# Altium footprint library TE0706.PcbLib: 46 footprints (part 2 of 3)
Each footprint in its own frame and in the unit in brackets; x right, y up, seen from the top. Pads: shape width x height; smd on the part's side, far side on the other; paste and mask are expansions set on the pad; w line width, h text height; cw(c..) or ccw(c..) is an arc to the next point about the centre after c.
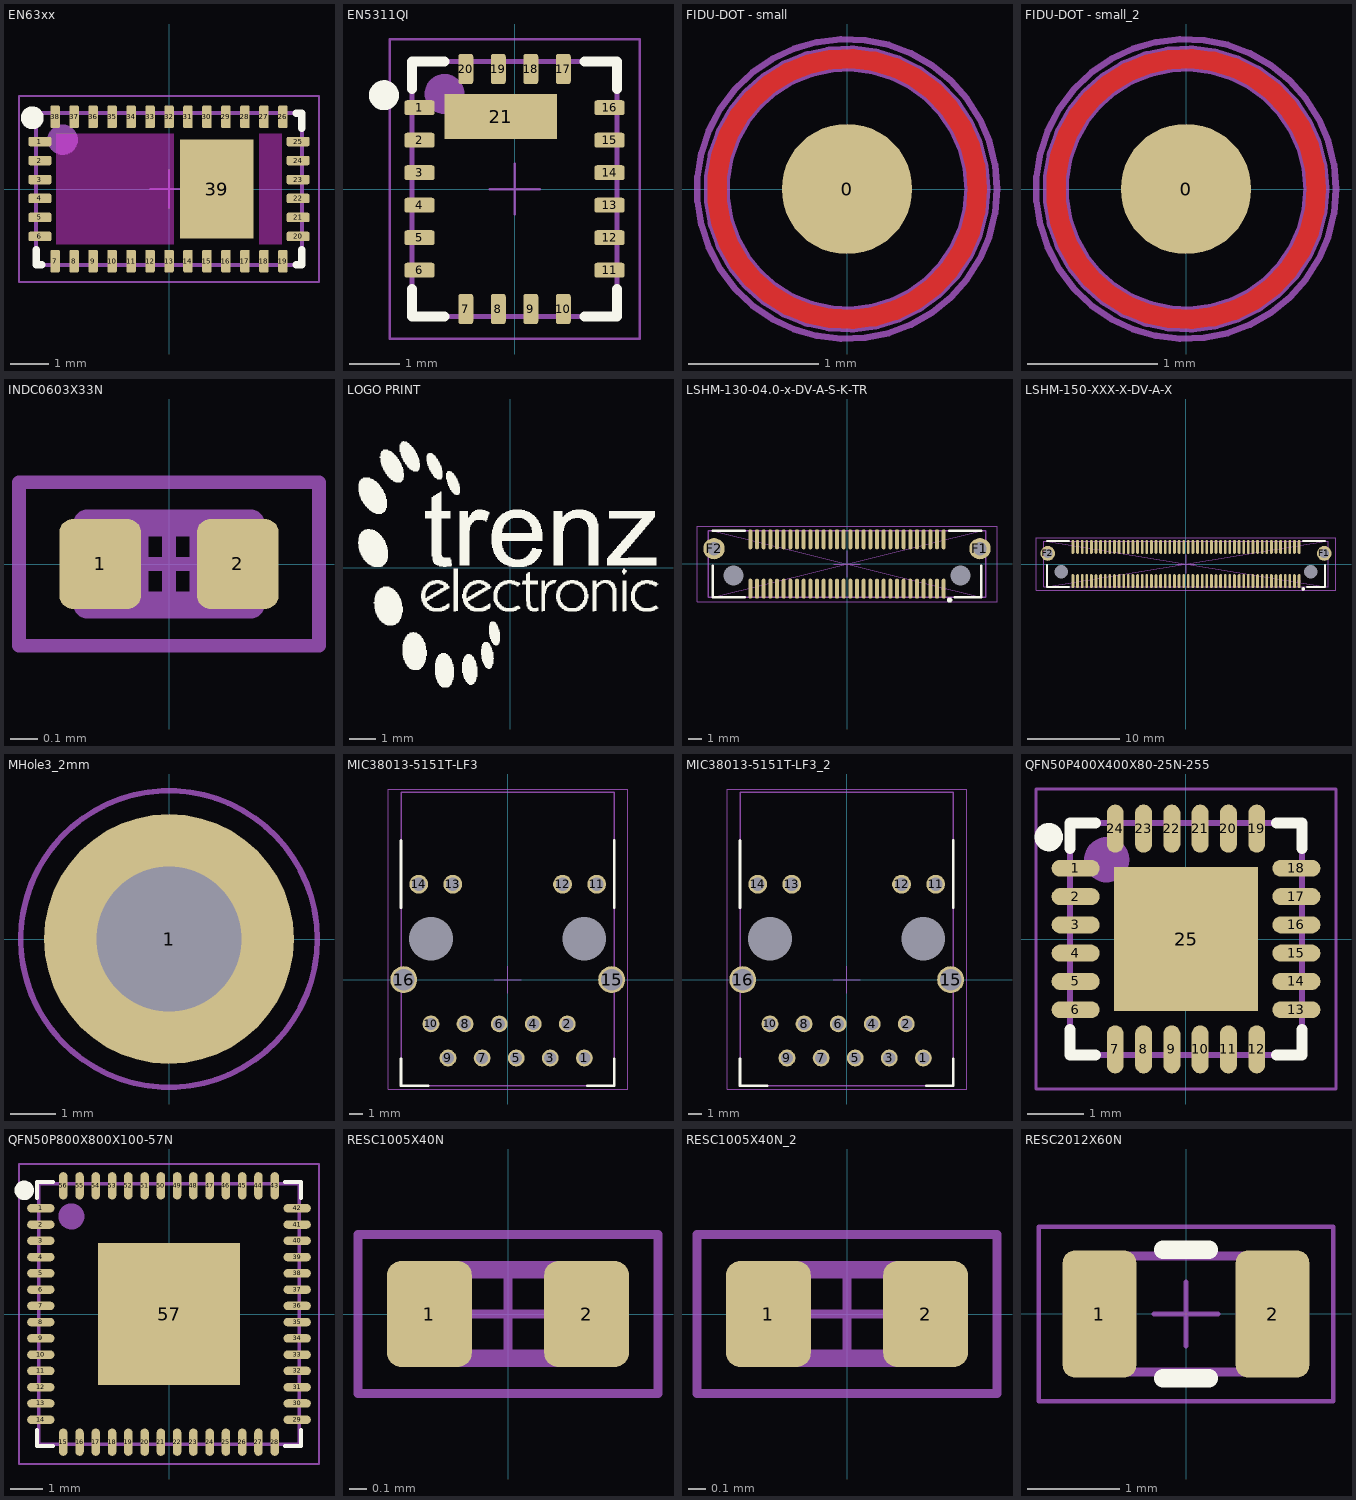
[diagram p1: the footprints below, top view; thin cyan lines are the x and y axes]

## EN63xx [mm]
height 1.9
pads (39):
  rrect33% 0.6x0.25 smd: 1(-3.4,1.25) 2(-3.4,0.75) 3(-3.4,0.25) 4(-3.4,-0.25) 5(-3.4,-0.75) 6(-3.4,-1.25) 20(3.4,-1.25) 21(3.4,-0.75) 22(3.4,-0.25) 23(3.4,0.25) 24(3.4,0.75) 25(3.4,1.25)
  rrect33% 0.25x0.6 smd: 7(-3,-1.9) 8(-2.5,-1.9) 9(-2,-1.9) 10(-1.5,-1.9) 11(-1,-1.9) 12(-0.5,-1.9) 13(0,-1.9) 14(0.5,-1.9) 15(1,-1.9) 16(1.5,-1.9) 17(2,-1.9) 18(2.5,-1.9) 19(3,-1.9) 26(3,1.9) 27(2.5,1.9) 28(2,1.9) 29(1.5,1.9) 30(1,1.9) 31(0.5,1.9) 32(0,1.9) 33(-0.5,1.9) 34(-1,1.9) 35(-1.5,1.9) 36(-2,1.9) 37(-2.5,1.9) 38(-3,1.9)
  rect 1.94x2.6 smd: 39(1.255,0)
Top Layer keep-out:
  region: -2.975,1.45 -2.975,-1.45 0.125,-1.45 0.125,1.45
  region: 2.975,1.45 2.975,-1.45 2.375,-1.45 2.375,1.45
Top Overlay:
  circle w0.3: c-3.6,1.875 r0.15
  lines w0.2: -3.5,-1.6 -3.5,-2 -3.35,-2 ; 3.35,-2 3.5,-2 3.5,-1.6 ; 3.35,2 3.5,2 3.5,1.6
Mechanical 13:
  circle w0.4: c-2.8,1.3 r0.2
  lines w0.1: -3.5,-2 3.5,-2 3.5,2 -3.5,2 -3.5,-2
  text ".Designator" at -0.5,-0.5 h1
Mechanical 15:
  lines w0.05: -0.5,0 0.5,0 ; 0,-0.5 0,0.5 ; -3.95,-2.45 3.95,-2.45 3.95,2.45 -3.95,2.45 -3.95,-2.45
3D body: height 1.91, standoff 0, extent -3.098,1.001 -2.5,1.6
3D body: height 1.9, standoff 0, extent -3.5,-2 3.5,2

## EN5311QI [mm]
height 1.15
pads (21):
  rrect33% 0.6x0.3 smd: 1(-1.9,1.625) 2(-1.9,0.975) 3(-1.9,0.325) 4(-1.9,-0.325) 5(-1.9,-0.975) 6(-1.9,-1.625) 11(1.9,-1.625) 12(1.9,-0.975) 13(1.9,-0.325) 14(1.9,0.325) 15(1.9,0.975) 16(1.9,1.625)
  rrect33% 0.3x0.6 smd: 7(-0.975,-2.4) 8(-0.325,-2.4) 9(0.325,-2.4) 10(0.975,-2.4) 17(0.975,2.4) 18(0.325,2.4) 19(-0.325,2.4) 20(-0.975,2.4)
  rect 2.25x0.9 smd: 21(-0.275,1.45)
Top Overlay:
  circle w0.3: c-2.61,1.875 r0.15
  lines w0.2: -2.05,-2 -2.05,-2.55 -1.4,-2.55 ; -2.05,2 -2.05,2.55 -1.4,2.55 ; 1.4,-2.55 2.05,-2.55 2.05,-2 ; 1.4,2.55 2.05,2.55 2.05,2
Mechanical 13:
  circle w0.4: c-1.4,1.9 r0.2
  lines w0.1: -2.05,-2.55 -2.05,2.55 2.05,2.55 2.05,-2.55 -2.05,-2.55
  text ".Designator" at -0.5,-0.5 h1
Mechanical 15:
  lines w0.05: -0.5,0 0.5,0 ; 0,-0.5 0,0.5 ; -2.5,-3 2.5,-3 2.5,3 -2.5,3 -2.5,-3
3D body: height 1.16, standoff 0, extent -1.698,1.601 -1.1,2.199
3D body: height 1.15, standoff 0, extent -2.05,-2.55 2.05,2.55

## FIDU-DOT - small [mm]
pads (1):
  round 1 smd paste-1: 0(0,0)
Top Layer:
  circle w0.15: c0,0 r1
Top Solder:
  circle w2: c0,0 r0.1
Mechanical 11:
  circle w0.005: c0,0 r1.075
Mechanical 13:
  circle w0.2: c0,0 r1
  text ".Designator" at -0.675,-0.5 h0.7
Mechanical 15:
  circle w0.05: c0,0 r1.15

## FIDU-DOT - small_2 [mm]
pads (1):
  round 1 smd paste-1: 0(0,0)
Top Layer:
  circle w0.15: c0,0 r1
Top Solder:
  circle w2: c0,0 r0.1
Mechanical 11:
  circle w0.005: c0,0 r1.075
Mechanical 13:
  circle w0.2: c0,0 r1
  text ".Designator" at -0.675,-0.5 h0.7
Mechanical 15:
  circle w0.05: c0,0 r1.15

## INDC0603X33N [mm]
height 0.33
pads (2):
  rrect33% 0.3x0.33 smd: 1(-0.252,0) 2(0.252,0)
Mechanical 13:
  lines w0.1: -0.125,-0.15 -0.125,0.15 ; 0.125,-0.15 0.125,0.15 ; -0.3,-0.15 0.3,-0.15 0.3,0.15 -0.3,0.15 -0.3,-0.15
  text ".Designator" at -0.1,0.37 h0.7
Mechanical 15:
  lines w0.05: -0.16,0 0.16,0 ; 0,-0.16 0,0.16 ; -0.55,-0.3 -0.55,0.3 0.55,0.3 0.55,-0.3 -0.55,-0.3
3D body: height 0.33, standoff 0, extent -0.15,-0.15 0.15,0.15
3D body: height 0.33, standoff 0, extent 0.15,-0.15 0.3,0.15
3D body: height 0.33, standoff 0, extent -0.3,-0.15 -0.15,0.15

## LOGO PRINT [mm]
Top Overlay:
  drawing of 1831 lines, arcs and shapes, not listed

## LSHM-130-04.0-x-DV-A-S-K-TR [mm]
height 5.45
pads (64):
  oval 0.3x1.5 smd: 1(7.25,-1.85) 2(7.25,1.85) 3(6.75,-1.85) 4(6.75,1.85) 5(6.25,-1.85) 6(6.25,1.85) 7(5.75,-1.85) 8(5.75,1.85) 9(5.25,-1.85) 10(5.25,1.85) 11(4.75,-1.85) 12(4.75,1.85) 13(4.25,-1.85) 14(4.25,1.85) 15(3.75,-1.85) 16(3.75,1.85) 17(3.25,-1.85) 18(3.25,1.85) 19(2.75,-1.85) 20(2.75,1.85) 21(2.25,-1.85) 22(2.25,1.85) 23(1.75,-1.85) 24(1.75,1.85) 25(1.25,-1.85) 26(1.25,1.85) 27(0.75,-1.85) 28(0.75,1.85) 29(0.25,-1.85) 30(0.25,1.85) 31(-0.25,-1.85) 32(-0.25,1.85) 33(-0.75,-1.85) 34(-0.75,1.85) 35(-1.25,-1.85) 36(-1.25,1.85) 37(-1.75,-1.85) 38(-1.75,1.85) 39(-2.25,-1.85) 40(-2.25,1.85) 41(-2.75,-1.85) 42(-2.75,1.85) 43(-3.25,-1.85) 44(-3.25,1.85) 45(-3.75,-1.85) 46(-3.75,1.85) 47(-4.25,-1.85) 48(-4.25,1.85) 49(-4.75,-1.85) 50(-4.75,1.85) 51(-5.25,-1.85) 52(-5.25,1.85) 53(-5.75,-1.85) 54(-5.75,1.85) 55(-6.25,-1.85) 56(-6.25,1.85) 57(-6.75,-1.85) 58(-6.75,1.85) 59(-7.25,-1.85) 60(-7.25,1.85)
  round 1.6 hole 1: F1(9.975,1.15) F2(-9.975,1.15)
  round 0 hole 1.5 unplated mask+0.75: H1(8.5,-0.85) H2(-8.5,-0.85)
Top Overlay:
  circle w0.2: c7.7,-2.7 r0.1
  lines w0.2: -10.075,-0.15 -10.075,-2.49 -7.675,-2.49 ; -10.075,2.49 -7.675,2.49 ; 7.675,2.49 10.075,2.49 ; 8.1,-2.49 10.075,-2.49 10.075,-0.15
Top Paste:
  drawing of 2 lines, arcs and shapes, not listed
Mechanical 11:
  lines w0.05: -10.075,-2.49 10.075,2.49 ; -10.075,2.49 10.075,-2.49
Mechanical 13:
  circle w0.3: c7.24,-1.85 r0.01
  lines w0.1: -10.423,-2.49 10.423,-2.49 10.423,2.49 -10.423,2.49 -10.423,-2.49
  text ".Designator" at 0.839,0.569 h1
  text "59" at -8.443,-2.006 h0.5
  text "60" at -8.451,1.542 h0.5
  text "2" at 7.746,1.593 h0.5
  text "1" at 7.807,-2.111 h0.5
Mechanical 15:
  lines w0.05: -1,0 1,0 ; 0,-1 0,1 ; -11.25,-2.85 -11.25,2.85 11.25,2.85 11.25,-2.85 -11.25,-2.85
3D body "LSHM-130-04.0-L-DV-A-S-K-TR.stp": height 5.45, standoff -1.8, extent -10.423,-2.49 10.423,2.49

## LSHM-150-XXX-X-DV-A-X [mm]
height 6
pads (104):
  oval 0.3x1.5 smd: 1(12.25,-1.85) 2(12.25,1.85) 3(11.75,-1.85) 4(11.75,1.85) 5(11.25,-1.85) 6(11.25,1.85) 7(10.75,-1.85) 8(10.75,1.85) 9(10.25,-1.85) 10(10.25,1.85) 11(9.75,-1.85) 12(9.75,1.85) 13(9.25,-1.85) 14(9.25,1.85) 15(8.75,-1.85) 16(8.75,1.85) 17(8.25,-1.85) 18(8.25,1.85) 19(7.75,-1.85) 20(7.75,1.85) 21(7.25,-1.85) 22(7.25,1.85) 23(6.75,-1.85) 24(6.75,1.85) 25(6.25,-1.85) 26(6.25,1.85) 27(5.75,-1.85) 28(5.75,1.85) 29(5.25,-1.85) 30(5.25,1.85) 31(4.75,-1.85) 32(4.75,1.85) 33(4.25,-1.85) 34(4.25,1.85) 35(3.75,-1.85) 36(3.75,1.85) 37(3.25,-1.85) 38(3.25,1.85) 39(2.75,-1.85) 40(2.75,1.85) 41(2.25,-1.85) 42(2.25,1.85) 43(1.75,-1.85) 44(1.75,1.85) 45(1.25,-1.85) 46(1.25,1.85) 47(0.75,-1.85) 48(0.75,1.85) 49(0.25,-1.85) 50(0.25,1.85) 51(-0.25,-1.85) 52(-0.25,1.85) 53(-0.75,-1.85) 54(-0.75,1.85) 55(-1.25,-1.85) 56(-1.25,1.85) 57(-1.75,-1.85) 58(-1.75,1.85) 59(-2.25,-1.85) 60(-2.25,1.85) 61(-2.75,-1.85) 62(-2.75,1.85) 63(-3.25,-1.85) 64(-3.25,1.85) 65(-3.75,-1.85) 66(-3.75,1.85) 67(-4.25,-1.85) 68(-4.25,1.85) 69(-4.75,-1.85) 70(-4.75,1.85) 71(-5.25,-1.85) 72(-5.25,1.85) 73(-5.75,-1.85) 74(-5.75,1.85) 75(-6.25,-1.85) 76(-6.25,1.85) 77(-6.75,-1.85) 78(-6.75,1.85) 79(-7.25,-1.85) 80(-7.25,1.85) 81(-7.75,-1.85) 82(-7.75,1.85) 83(-8.25,-1.85) 84(-8.25,1.85) 85(-8.75,-1.85) 86(-8.75,1.85) 87(-9.25,-1.85) 88(-9.25,1.85) 89(-9.75,-1.85) 90(-9.75,1.85) 91(-10.25,-1.85) 92(-10.25,1.85) 93(-10.75,-1.85) 94(-10.75,1.85) 95(-11.25,-1.85) 96(-11.25,1.85) 97(-11.75,-1.85) 98(-11.75,1.85) 99(-12.25,-1.85) 100(-12.25,1.85)
  round 1.6 hole 1: F1(14.975,1.15) F2(-14.975,1.15)
  round 0 hole 1.45 unplated: H1(-13.5,-0.85) H2(13.5,-0.85)
Top Overlay:
  circle w0.2: c12.7,-2.7 r0.1
  lines w0.2: -15.075,-0.125 -15.075,-2.49 -12.675,-2.49 ; -15.075,2.49 -12.675,2.49 ; 12.675,2.49 15.075,2.49 ; 13.075,-2.49 15.075,-2.49 15.075,-0.125
Top Paste:
  drawing of 2 lines, arcs and shapes, not listed
Mechanical 11:
  lines w0.05: -15.075,-2.49 15.075,2.49 ; -15.075,2.49 15.075,-2.49
Mechanical 13:
  circle w0.3: c12.24,-1.85 r0.01
  lines w0.1: -15.423,-2.49 -15.423,2.49 15.423,2.49 15.423,-2.49 -15.423,-2.49
  text "100" at -13.724,1.43 h0.5
  text "99" at -13.48,-1.979 h0.5
  text "2" at 12.506,1.593 h0.5
  text "1" at 12.614,-2.049 h0.5
  text ".Designator" at -0.077,-0.082 h1
Mechanical 15:
  lines w0.05: -1,0 1,0 ; 0,-1 0,1 ; -16.25,-2.85 -16.25,2.85 16.25,2.85 16.25,-2.85 -16.25,-2.85
3D body "LSHM-150-04.0-L-DV-A-S-K-TR.stp": height 5.45, standoff -1.8, extent -15.423,-2.49 15.423,2.49

## MHole3_2mm [mm]
pads (1):
  round 5.5 hole 3.2: 1(0,0)
Mechanical 13:
  circle w0.1: c0,0 r1.6
  circle w0.1: c0,0 r3.25
Mechanical 14:
  circle w0.1: c0,0 r3.25
  circle w0.1: c0,0 r1.6
Mechanical 15:
  circle w0.05: c0,0 r3.3
  lines w0.05: -1,0 1,0 ; 0,-1 0,1
Mechanical 16:
  circle w0.05: c0,0 r3.3
3D body "SW3dPS-DIN 967.STEP": height 2.33, standoff -4, extent -3.75,-3.75 3.75,3.75

## MIC38013-5151T-LF3 [mm]
height 13.74
pads (18):
  round 1.25 hole 0.9: 1(5.715,-5.84) 2(4.445,-3.3) 3(3.175,-5.84) 4(1.905,-3.3) 5(0.635,-5.84) 6(-0.635,-3.3) 7(-1.905,-5.84) 8(-3.175,-3.3) 9(-4.445,-5.84) 10(-5.715,-3.3)
  round 1.4 hole 1: 11(6.63,7.11) 12(4.09,7.11) 13(-4.09,7.11) 14(-6.63,7.11)
  round 2 hole 1.6: 15(7.745,0) 16(-7.745,0)
  round 0 hole 3.25 unplated: H1(5.715,3.05) H2(-5.715,3.05)
Top Overlay:
  lines w0.2: -7.94,-5.9 -7.94,-7.9 -5.94,-7.9 ; -7.94,5.36 -7.94,10.36 ; 5.94,-7.9 7.94,-7.9 7.94,-5.9 ; 7.94,5.36 7.94,10.36
Mechanical 13:
  lines w0.1: -7.94,-7.9 -7.94,13.94 7.94,13.94 7.94,-7.9 -7.94,-7.9
  text ".Designator" at -1,2 h2
Mechanical 15:
  lines w0.05: -1,0 1,0 ; 0,-1 0,1 ; -8.9,-8.15 8.95,-8.15 8.95,14.2 -8.9,14.2 -8.9,-8.15
3D body "7499111446.stp": height 15.81, standoff -3.17, extent -9.923,-7.96 9.923,13.88

## MIC38013-5151T-LF3_2 [mm]
pads (18):
  round 1.25 hole 0.9: 1(5.715,-5.84) 2(4.445,-3.3) 3(3.175,-5.84) 4(1.905,-3.3) 5(0.635,-5.84) 6(-0.635,-3.3) 7(-1.905,-5.84) 8(-3.175,-3.3) 9(-4.445,-5.84) 10(-5.715,-3.3)
  round 1.4 hole 1: 11(6.63,7.11) 12(4.09,7.11) 13(-4.09,7.11) 14(-6.63,7.11)
  round 2 hole 1.6: 15(7.745,0) 16(-7.745,0)
  round 0 hole 3.25 unplated: H1(5.715,3.05) H2(-5.715,3.05)
Top Overlay:
  lines w0.2: -7.94,-5.9 -7.94,-7.9 -5.94,-7.9 ; -7.94,5.36 -7.94,10.36 ; 5.94,-7.9 7.94,-7.9 7.94,-5.9 ; 7.94,5.36 7.94,10.36
Mechanical 13:
  lines w0.1: -7.94,-7.9 -7.94,13.94 7.94,13.94 7.94,-7.9 -7.94,-7.9
  text ".Designator" at -1,2 h2
Mechanical 15:
  lines w0.05: -1,0 1,0 ; 0,-1 0,1 ; -8.9,-8.15 8.95,-8.15 8.95,14.2 -8.9,14.2 -8.9,-8.15
3D body "7499111446.stp": height 15.81, standoff -3.17, extent -9.923,-7.96 9.923,13.88

## QFN50P400X400X80-25N-255 [mm] "QFN, 24-Leads, Body 4,1x4,1mm (max), Pitch 0,50mm, IPC Medium Density"
height 0.8
pads (25):
  oval 0.85x0.3 smd: 1(-1.95,1.25) 2(-1.95,0.75) 3(-1.95,0.25) 4(-1.95,-0.25) 5(-1.95,-0.75) 6(-1.95,-1.25) 13(1.95,-1.25) 14(1.95,-0.75) 15(1.95,-0.25) 16(1.95,0.25) 17(1.95,0.75) 18(1.95,1.25)
  oval 0.3x0.85 smd: 7(-1.25,-1.95) 8(-0.75,-1.95) 9(-0.25,-1.95) 10(0.25,-1.95) 11(0.75,-1.95) 12(1.25,-1.95) 19(1.25,1.95) 20(0.75,1.95) 21(0.25,1.95) 22(-0.25,1.95) 23(-0.75,1.95) 24(-1.25,1.95)
  rect 2.55x2.55 smd: 25(0,0)
Top Overlay:
  circle w0.25: c-2.425,1.8 r0.125
  lines w0.2: -2.05,-1.6 -2.05,-2.05 -1.6,-2.05 ; -2.05,1.6 -2.05,2.05 -1.6,2.05 ; 1.6,-2.05 2.05,-2.05 2.05,-1.6 ; 1.6,2.05 2.05,2.05 2.05,1.6
Mechanical 13:
  circle w0.4: c-1.4,1.4 r0.2
  lines w0.1: -2.05,-2.05 -2.05,2.05 2.05,2.05 2.05,-2.05 -2.05,-2.05
  text ".Designator" at 0.93,0.52 h1
Mechanical 15:
  lines w0.05: -0.5,0 0.5,0 ; 0,-0.5 0,0.5 ; -2.65,-2.65 -2.65,2.65 2.65,2.65 2.65,-2.65 -2.65,-2.65
3D body "User Library-QFN24-0_5.STEP": height 1, standoff 0, extent -2,-2 2,2

## QFN50P800X800X100-57N [mm]
height 1
pads (57):
  oval 0.84x0.26 smd: 1(-3.94,3.25) 2(-3.94,2.75) 3(-3.94,2.25) 4(-3.94,1.75) 5(-3.94,1.25) 6(-3.94,0.75) 7(-3.94,0.25) 8(-3.94,-0.25) 9(-3.94,-0.75) 10(-3.94,-1.25) 11(-3.94,-1.75) 12(-3.94,-2.25) 13(-3.94,-2.75) 14(-3.94,-3.25) 29(3.94,-3.25) 30(3.94,-2.75) 31(3.94,-2.25) 32(3.94,-1.75) 33(3.94,-1.25) 34(3.94,-0.75) 35(3.94,-0.25) 36(3.94,0.25) 37(3.94,0.75) 38(3.94,1.25) 39(3.94,1.75) 40(3.94,2.25) 41(3.94,2.75) 42(3.94,3.25)
  oval 0.26x0.84 smd: 15(-3.25,-3.94) 16(-2.75,-3.94) 17(-2.25,-3.94) 18(-1.75,-3.94) 19(-1.25,-3.94) 20(-0.75,-3.94) 21(-0.25,-3.94) 22(0.25,-3.94) 23(0.75,-3.94) 24(1.25,-3.94) 25(1.75,-3.94) 26(2.25,-3.94) 27(2.75,-3.94) 28(3.25,-3.94) 43(3.25,3.94) 44(2.75,3.94) 45(2.25,3.94) 46(1.75,3.94) 47(1.25,3.94) 48(0.75,3.94) 49(0.25,3.94) 50(-0.25,3.94) 51(-0.75,3.94) 52(-1.25,3.94) 53(-1.75,3.94) 54(-2.25,3.94) 55(-2.75,3.94) 56(-3.25,3.94)
  rect 4.37x4.37 smd: 57(0,0)
Top Overlay:
  circle w0.3: c-4.45,3.8 r0.15
  lines w0.12: -4.06,-3.56 -4.06,-4.06 -3.56,-4.06 ; -4.06,3.56 -4.06,4.06 -3.56,4.06 ; 3.56,-4.06 4.06,-4.06 4.06,-3.56 ; 3.56,4.06 4.06,4.06 4.06,3.56
Top Paste:
  region: -1.86,-1.86 -0.32,-1.86 -0.32,-0.32 -1.86,-0.32
  region: 0.32,-1.86 1.86,-1.86 1.86,-0.32 0.32,-0.32
  region: -1.86,0.32 -0.32,0.32 -0.32,1.86 -1.86,1.86
  region: 0.32,0.32 1.86,0.32 1.86,1.86 0.32,1.86
Mechanical 13:
  circle w0.4: c-3,3 r0.2
  lines w0.1: -4,-4 -4,4 4,4 4,-4 -4,-4
  text ".Designator" at 0.938,0.3 h1
Mechanical 15:
  lines w0.05: -0.35,0 0.35,0 ; 0,-0.35 0,0.35 ; -4.61,-4.61 -4.61,4.61 4.61,4.61 4.61,-4.61 -4.61,-4.61
3D body "User Library-QFN56 (8x8).STEP": height 0.94, standoff -0.01, extent -4.015,-4.015 4.015,4.015

## RESC1005X40N [mm] "Vishay D0402 1 x 0.5mm (+/- 0.05), 0.2mm +/-0.1mm Kontakte"
height 0.35
pads (2):
  rrect33% 0.48x0.6 smd: 1(-0.445,0) 2(0.445,0)
Mechanical 13:
  lines w0.1: -0.3,-0.25 -0.3,0.25 ; 0.3,-0.25 0.3,0.25 ; -0.5,-0.25 0.5,-0.25 0.5,0.25 -0.5,0.25 -0.5,-0.25
  text ".Designator" at 1.05,-0.35 h0.7
Mechanical 15:
  lines w0.05: -0.225,0 0.225,0 ; 0,-0.225 0,0.225 ; -0.85,-0.45 0.85,-0.45 0.85,0.45 -0.85,0.45 -0.85,-0.45
3D body "RESC1005X04N(3).STEP": height 0.35, standoff 0, extent -0.5,-0.25 0.5,0.25

## RESC1005X40N_2 [mm]
pads (2):
  rrect33% 0.48x0.6 smd: 1(-0.445,0) 2(0.445,0)
Mechanical 13:
  lines w0.1: -0.3,-0.25 -0.3,0.25 ; 0.3,-0.25 0.3,0.25 ; -0.5,-0.25 -0.5,0.25 0.5,0.25 0.5,-0.25 -0.5,-0.25
  text ".Designator" at 0.855,1.418 h0.7
Mechanical 15:
  lines w0.05: -0.225,0 0.225,0 ; 0,-0.225 0,0.225 ; -0.85,-0.45 -0.85,0.45 0.85,0.45 0.85,-0.45 -0.85,-0.45
3D body "RESC1005X04N(3).STEP": height 0.35, standoff 0, extent -0.5,-0.25 0.5,0.25

## RESC2012X60N [mm]
height 0.5
pads (2):
  rrect33% 0.8x1.38 smd: 1(-0.94,0) 2(0.94,0)
Top Overlay:
  lines w0.2: -0.25,-0.7 0.25,-0.7 ; -0.25,0.7 0.25,0.7
Mechanical 13:
  lines w0.1: -0.6,-0.63 -0.6,0.63 ; 0.6,-0.63 0.6,0.63 ; -1,-0.63 -1,0.63 1,0.63 1,-0.63 -1,-0.63
  text ".Designator" at 0.976,1.673 h0.7
Mechanical 15:
  lines w0.05: -0.35,0 0.35,0 ; 0,-0.35 0,0.35 ; -1.6,-0.95 -1.6,0.95 1.6,0.95 1.6,-0.95 -1.6,-0.95
3D body "User Library-RESC2012X05N.STEP": height 0.45, standoff 0, extent -1,-0.625 1,0.625